# Altium footprint library Standard.PcbLib: 148 footprints (part 5 of 10)
Each footprint in its own frame and in the unit in brackets; x right, y up, seen from the top. Pads: shape width x height; smd on the part's side, far side on the other; paste and mask are expansions set on the pad; w line width, h text height; cw(c..) or ccw(c..) is an arc to the next point about the centre after c.
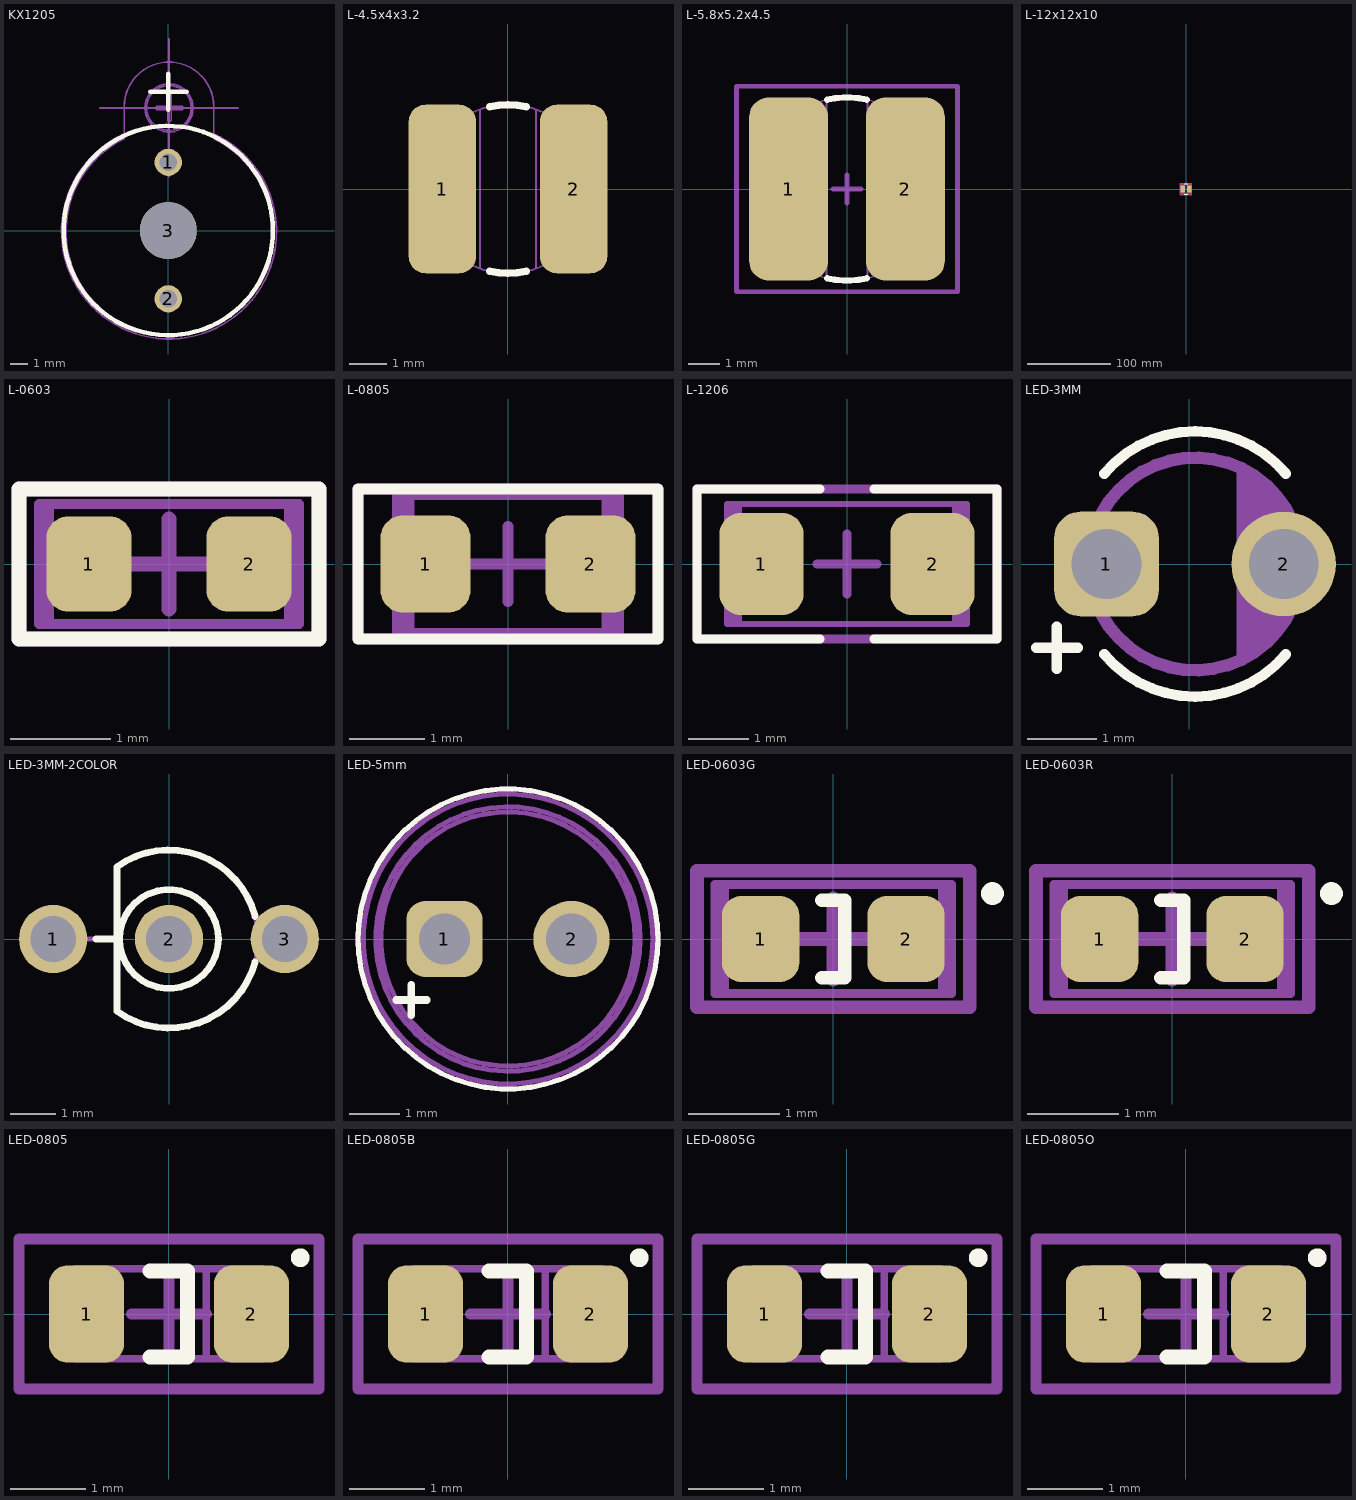
[diagram p4: the footprints below, top view; thin cyan lines are the x and y axes]

## KX1205 [mil]
pads (3):
  round 60 hole 38: 1(0,150) 2(0,-150)
  round 125 hole 125 unplated: 3(0,0)
Top Overlay:
  circle w10: c0,0 r230
  lines w10: -40,305 40,305 ; 0,265 0,345
Top Assembly:
  circle w3.94: c1.57,269.56 r52.93
  circle w3.94: c1.57,269.56 r48.99
  lines w3.94: -149.78,269.56 -96.85,269.56 1.57,269.56 ; -96.85,212.77 ccw(c1.57,-1.97) 100,212.77 ; 1.57,118.2 1.57,171.13 1.57,269.56 ; 1.57,420.92 1.57,367.98 1.57,269.56 ; 152.93,269.56 100,269.56 1.57,269.56 ; -96.85,201.89 ccw(c1.57,-1.97) 100,201.89 100,271.82 ccw(c1.57,271.82) -96.85,271.82 -96.85,201.89 ; -25.68,265.78 -25.68,273.26 -1.1,273.26 -1.1,297.84 6.38,297.84 6.38,273.26 30.95,273.26 30.95,265.78 6.38,265.78 6.38,241.21 -1.1,241.21 -1.1,265.78 -25.68,265.78
3D body "ALSRobot-BUZZER.step": height 379.92, standoff -177.17, extent -236.22,-236.22 236.22,372.21

## L-4.5x4x3.2 [mm]
pads (2):
  rrect50% 1.8x4.5 smd: 1(-1.75,0) 2(1.75,0)
Top Overlay:
  lines w0.2: -0.488,-2.196 ccw(c0,0) 0.488,-2.196 ; -0.488,2.196 cw(c0,0) 0.488,2.196
Top Assembly:
  lines w0.05: -2.23,-0.301 ccw(c0,0) 2.229,-0.304 ; -2.229,0.304 cw(c0,0) 2.23,0.301 ; -2.225,-0.3 -1.946,-0.3 ; -2.225,0.3 -1.946,0.3 ; -1.981,-0.3 ccw(c-1.981,0) -1.981,0.3 ; -0.75,-2.108 -0.75,2.125 ; 0.75,-2.108 0.75,2.1 ; 1.946,-0.3 2.225,-0.3 ; 1.946,0.3 2.225,0.3 ; 1.981,-0.3 cw(c1.981,0) 1.981,0.3
3D body "User Library-Inductor SDR0403 Series.STEP": height 3.25, standoff 0, extent -2.201,-2.25 2.201,2.25

## L-5.8x5.2x4.5 [mm] "Дроссель SMD"
height 4.5
pads (2):
  rrect50% 2.5x5.8 smd: 1(-1.85,0) 2(1.85,0)
Top Overlay:
  lines w0.2: -0.629,-2.831 ccw(c0,0) 0.629,-2.831 ; -0.629,2.831 cw(c0,0) 0.629,2.831
Top Assembly:
  lines w0.05: -2.681,-0.3 ccw(c-2.681,0) -2.681,0.3 ; -2.646,-0.3 -2.786,-0.3 -2.874,-0.388 ccw(c0,0) 2.873,-0.392 ; -2.646,0.3 -2.777,0.3 -2.873,0.396 cw(c0,0) 2.874,0.388 2.778,0.291 2.647,0.291 ; -0.65,-2.825 -0.65,2.825 ; 0.65,-2.825 0.65,2.825 ; 2.647,-0.309 2.788,-0.309 2.875,-0.396 ; 2.682,-0.309 cw(c2.682,-0.009) 2.682,0.291
Top Component Outline:
  lines w0.15: -0.45,0 0.45,0 ; 0,-0.45 0,0.45 ; -3.5,-3.25 -3.5,3.25 3.5,3.25 3.5,-3.25 -3.5,-3.25
3D body "SMD_Inductor_CD54.step": height 4.49, standoff -0.01, extent -2.9,-2.6 2.9,2.6

## L-12x12x10 [mm]
pads (2):
  rect 5x9 smd: 1(-4,0) 2(4,0)
Top Layer:
  region: -6.5,4.6 -6.5,4.758 -6.439,5.067 -6.318,5.358 -6.143,5.62 -5.92,5.843 -5.658,6.018 -5.367,6.139 -5.058,6.2 -4.9,6.2 -2.5,6.2 -2.5,3.874 -6.5,3.874
  region: -6.5,-4.6 -6.5,-4.758 -6.439,-5.067 -6.318,-5.358 -6.143,-5.62 -5.92,-5.843 -5.658,-6.018 -5.367,-6.139 -5.058,-6.2 -4.9,-6.2 -2.5,-6.2 -2.5,-3.874 -6.5,-3.874
  region: 6.5,-4.6 6.5,-4.758 6.439,-5.067 6.318,-5.358 6.143,-5.62 5.92,-5.843 5.658,-6.018 5.367,-6.139 5.058,-6.2 4.9,-6.2 2.5,-6.2 2.5,-3.969 6.5,-3.969
  region: 6.5,4.6 6.5,4.758 6.439,5.067 6.318,5.358 6.143,5.62 5.92,5.843 5.658,6.018 5.367,6.139 5.058,6.2 4.9,6.2 2.5,6.2 2.5,3.874 6.5,3.874
Top Overlay:
  lines w0.2: -2.046,-6.15 -2.046,-6.15 2.046,-6.15 ; -2.046,6.15 2.046,6.15
Top Solder:
  region: -6.6,-4.6 -6.602,-4.762 -6.545,-5.081 -6.428,-5.382 -6.256,-5.656 -6.034,-5.892 -5.771,-6.081 -5.476,-6.216 -5.162,-6.293 -5,-6.3 -2.4,-6.3 -2.4,-4.5 -6.6,-4.5
  region: -6.6,4.6 -6.602,4.762 -6.545,5.081 -6.428,5.382 -6.256,5.656 -6.034,5.892 -5.771,6.081 -5.476,6.216 -5.162,6.293 -5,6.3 -2.4,6.3 -2.4,4.5 -6.6,4.5
  region: 6.6,4.6 6.602,4.762 6.545,5.081 6.428,5.383 6.256,5.656 6.034,5.892 5.771,6.081 5.476,6.216 5.162,6.293 5,6.3 2.4,6.3 2.4,4.5 6.6,4.5
  region: 6.6,-4.6 6.602,-4.762 6.545,-5.081 6.428,-5.383 6.256,-5.656 6.034,-5.892 5.771,-6.081 5.476,-6.216 5.162,-6.293 5,-6.3 2.4,-6.3 2.4,-4.5 6.6,-4.5
Top Assembly:
  circle w0.05: c0,0 r5.25
  circle w0.05: c-2.828,2.828 r0.25
  circle w0.05: c0,0 r5
  lines w0.05: -4.58,-3.045 -4.359,-2.926 ; -4.58,3.045 -4.359,2.926 ; -4.049,-3.342 -4.581,-3.874 ccw(c0,0) -3.874,-4.581 -3.342,-4.049 ; -4.049,3.342 -4.581,3.874 cw(c0,0) -3.874,4.581 -3.342,4.049 ; -3.045,-4.58 -2.926,-4.359 ; -3.045,4.58 -2.926,4.359 ; -2.165,-5.056 -2.046,-4.835 ; -2.165,5.056 -2.046,4.835 ; 2.046,-4.835 2.165,-5.056 ; 2.046,4.835 2.165,5.056 ; 2.926,-4.359 3.045,-4.58 ; 2.926,4.359 3.045,4.58 ; 3.342,-4.049 3.874,-4.581 ccw(c0,0) 4.581,-3.874 4.049,-3.342 ; 3.342,4.049 3.874,4.581 cw(c0,0) 4.581,3.874 4.049,3.342 ; 4.359,-2.926 4.58,-3.045 ; 4.359,2.926 4.58,3.045 ; -6.25,-4.25 ccw(c-4.25,-4.25) -4.25,-6.25 ; -6.25,-4.25 -6.15,-4.25 ; -6.25,-4.25 -6.25,4.25 ; -6.25,4.25 cw(c-4.25,4.25) -4.25,6.25 ; -6.25,4.25 -6.15,4.25 ; -6.15,-4.25 ccw(c-4.25,-4.25) -4.25,-6.15 ; -6.15,-4.25 -6.15,4.25 ; -6.15,4.25 cw(c-4.25,4.25) -4.25,6.15 ; -4.809,-2.966 cw(c0,0) -4.809,2.966 ; -4.809,-2.966 ccw(c-4.25,-4.25) -2.966,-4.809 ; -4.809,-2.966 cw(c-7.071,-5.196) -4.699,-3.083 ; -4.809,-2.966 cw(c11.081,-87.461) -4.65,-2.937 ; -4.809,2.966 ccw(c11.081,87.461) -4.65,2.937 ; -4.809,2.966 ccw(c-7.056,5.182) -4.699,3.083 ; -4.809,2.966 cw(c-4.25,4.25) -2.966,4.809 ; -4.699,-3.083 ccw(c-4.25,-4.25) -3.083,-4.699 ; -4.699,-3.083 ccw(c-4.735,-2.99) -4.65,-2.937 ; -4.699,-3.083 -4.581,-3.044 -4.65,-2.937 ; -4.699,3.083 cw(c-4.735,2.99) -4.65,2.937 ; -4.699,3.083 cw(c-4.25,4.25) -3.083,4.699 ; -4.699,3.083 -4.581,3.044 -4.65,2.937 ; -4.65,-2.937 cw(c0,0) -4.65,2.937 ; -4.25,-6.25 -4.25,-6.15 ; -4.25,-6.25 4.25,-6.25 ; -4.25,-6.15 4.25,-6.15 ; -4.25,6.15 4.25,6.15 ; -4.25,6.15 -4.25,6.25 ; -4.25,6.25 4.25,6.25 ; -3.083,-4.699 cw(c-5.196,-7.071) -2.966,-4.809 ; -3.083,-4.699 cw(c-2.99,-4.735) -2.937,-4.65 ; -3.083,-4.699 -3.044,-4.581 -2.937,-4.65 ; -3.083,4.699 ccw(c-5.182,7.056) -2.966,4.809 ; -3.083,4.699 ccw(c-2.99,4.735) -2.937,4.65 ; -3.083,4.699 -3.044,4.581 -2.937,4.65 ; -2.966,-4.809 ccw(c0,0) 2.966,-4.809 ; -2.966,-4.809 ccw(c-91.284,11.797) -2.937,-4.65 ; -2.966,4.809 cw(c0,0) 2.966,4.809 ; -2.966,4.809 cw(c-87.461,-11.081) -2.937,4.65 ; -2.937,-4.65 ccw(c0,0) 2.937,-4.65 ; -2.937,4.65 cw(c0,0) 2.937,4.65 ; 2.937,-4.65 ccw(c91.284,11.797) 2.966,-4.809 ; 2.937,-4.65 cw(c2.99,-4.735) 3.083,-4.699 ; 2.937,-4.65 3.044,-4.581 3.083,-4.699 ; 2.937,4.65 cw(c87.461,-11.081) 2.966,4.809 ; 2.937,4.65 ccw(c2.99,4.735) 3.083,4.699 ; 2.937,4.65 3.044,4.581 3.083,4.699 ; 2.966,-4.809 cw(c5.196,-7.071) 3.083,-4.699 ; 2.966,-4.809 ccw(c4.25,-4.25) 4.809,-2.966 ; 2.966,4.809 ccw(c5.182,7.056) 3.083,4.699 ; 2.966,4.809 cw(c4.25,4.25) 4.809,2.966 ; 3.083,-4.699 ccw(c4.25,-4.25) 4.699,-3.083 ; 3.083,4.699 cw(c4.25,4.25) 4.699,3.083 ; 4.25,-6.25 ccw(c4.25,-4.25) 6.25,-4.25 ; 4.25,-6.25 4.25,-6.15 ; 4.25,-6.15 ccw(c4.25,-4.25) 6.15,-4.25 ; 4.25,6.15 cw(c4.25,4.25) 6.15,4.25 ; 4.25,6.15 4.25,6.25 ; 4.25,6.25 cw(c4.25,4.25) 6.25,4.25 ; 4.65,-2.937 cw(c-11.797,-91.284) 4.809,-2.966 ; 4.65,-2.937 ccw(c0,0) 4.65,2.937 ; 4.65,-2.937 ccw(c4.735,-2.99) 4.699,-3.083 ; 4.65,-2.937 4.581,-3.044 4.699,-3.083 ; 4.65,2.937 ccw(c-11.797,91.284) 4.809,2.966 ; 4.65,2.937 cw(c4.735,2.99) 4.699,3.083 ; 4.65,2.937 4.581,3.044 4.699,3.083 ; 4.699,-3.083 cw(c7.071,-5.196) 4.809,-2.966 ; 4.699,3.083 ccw(c7.056,5.182) 4.809,2.966 ; 4.809,-2.966 ccw(c0,0) 4.809,2.966 ; 6.15,-4.25 6.25,-4.25 ; 6.15,-4.25 6.15,4.25 ; 6.15,4.25 6.25,4.25 ; 6.25,-4.25 6.25,4.25
Top Component Outline:
  lines w0.15: -0.45,0 0.45,0 ; 0,-0.45 0,0.45 ; -7,-6.75 7,-6.75 7,6.75 -7,6.75 -7,-6.75
3D body "User Library-SRR1210A.STEP": height 10, standoff 0, extent -6.004,-6 6.004,6

## L-0603 [mm]
height 0.6
pads (2):
  rrect50% 0.85x0.95 smd: 1(-0.8,0) 2(0.8,0)
Top Overlay:
  lines w0.15: -1.5,-0.75 -1.5,0.75 0,0.75 1.5,0.75 1.5,-0.75 0,-0.75 -1.5,-0.75
Top Assembly:
  lines w0.1: -1.2,-0.6 -1.2,0.6 ; 1.2,-0.6 1.2,0.6 ; -1.3,-0.6 -1.3,0.6 1.3,0.6 1.3,-0.6 -1.3,-0.6
Top Component Outline:
  lines w0.15: -0.45,0 0.45,0 ; 0,-0.45 0,0.45 ; -1.5,-0.75 -1.5,0.75 1.5,0.75 1.5,-0.75 -1.5,-0.75
3D body "INDC-0603 (1).stp": height 0.95, standoff 0, extent -0.875,-0.475 0.875,0.475

## L-0805 [mm] "hip Inductor, 2-Leads, Body 2,00x1,25mm, IPC Medium Density"
pads (2):
  rrect50% 1.2x1.3 smd: 1(-1.1,0) 2(1.1,0)
Top Overlay:
  lines w0.15: -2,-1 2,-1 2,1 -2,1 -2,-1
Top Assembly:
  rectangle: 1.3,-0.9 1.5,0.9
  rectangle: -1.5,-0.9 -1.3,0.9
  lines w0.1: -1.3,-0.9 -1.3,0.9 ; 1.3,-0.9 1.3,0.9 ; -1.5,-0.9 1.5,-0.9 1.5,0.9 -1.5,0.9 -1.5,-0.9
Top Component Outline:
  lines w0.15: -0.5,0 0.5,0 ; 0,-0.5 0,0.5 ; -2,-1 2,-1 2,1 -2,1 -2,-1
3D body "User Library-ind_0805.STEP": height 0.95, standoff 0, extent -1,-0.6 1,0.6

## L-1206 [mm] "Chip Inductor 2-Leads, Body 3,20x1,60mm, IPC Medium Density"
height 0.7
pads (2):
  rrect50% 1.4x1.7 smd: 1(-1.425,0) 2(1.425,0)
Top Overlay:
  lines w0.15: -0.45,-1.25 -2.5,-1.25 -2.5,1.25 -0.45,1.25 ; 0.45,-1.25 2.5,-1.25 2.5,1.25 0.45,1.25
Top Assembly:
  rectangle: -1.95,-1 -1.75,1
  rectangle: 1.75,-1 1.95,1
  lines w0.1: -2,-1 2,-1 2,1 -2,1 -2,-1
Top Component Outline:
  lines w0.15: -0.5,0 0.5,0 ; 0,-0.5 0,0.5 ; -2.5,-1.25 2.5,-1.25 2.5,1.25 -2.5,1.25 -2.5,-1.25
3D body "User Library-BLM31PG330SN1.STEP": height 1.11, standoff -0.01, extent -1.6,-0.81 1.6,0.81

## LED-3MM [mm]
pads (2):
  rrect50% 1.5x1.5 hole 1: 1(-1.19,0)
  round 1.5 hole 1: 2(1.35,0)
Top Overlay:
  lines w0.15: -2.2,-1.2 -1.6,-1.2 ; -1.9,-1.5 -1.9,-0.9 ; -1.223,-1.293 ccw(c0.08,-0.2) 1.383,-1.293 ; -1.223,1.293 cw(c0.08,0.2) 1.383,1.293
Top Assembly:
  circle w0.178: c0.08,0 r1.524
  region: 0.68,1.4 0.68,-1.4 0.88,-1.3 1.08,-1.1 1.18,-1 1.48,-0.6 1.58,-0.3 1.58,0.2 1.48,0.5 1.38,0.7 1.28,0.9 1.08,1.1 0.88,1.3
3D body "User Library-Led round 3 mm Kingbright.step": height 29.6, standoff -2, extent -1.5,-1.6 1.7,1.6

## LED-3MM-2COLOR [mm]
pads (3):
  round 1.5 hole 1: 1(-2.54,0) 2(0,0) 3(2.54,0)
Top Overlay:
  circle w0.15: c0,0 r1.085
  lines w0.15: -1.6,0 -1.143,0 ; -1.144,-1.583 ccw(c0,0) 1.888,-0.5 ; -1.143,-1.583 -1.143,1.586 ; -1.14,1.586 cw(c0,0) 1.889,0.496
Top Assembly:
  circle w0.1: c0,0 r1.085
  lines w0.1: -2.286,0 -1.143,0 ; -1.143,-1.524 -1.143,1.524 ; -1.111,-1.606 ccw(c0,0) -1.111,1.606 ; 1.905,0 2.54,0
3D body "User Library-Lumex_SSL-LX3059IGW_BicolorLed.step": height 15, standoff -1.18, extent -2.794,-1.992 2.794,1.992

## LED-5mm [mm]
pads (2):
  rrect50% 1.5x1.5 hole 1: 1(-1.25,0)
  round 1.5 hole 1: 2(1.25,0)
Top Overlay:
  circle w0.1: c0,0 r2.95
  lines w0.15: -2.2,-1.2 -1.6,-1.2 ; -1.9,-1.5 -1.9,-0.9
Top Assembly:
  circle w0.1: c0,0 r2.95
  circle w0.1: c0,0 r2.85
  circle w0.1: c0,0 r2.6
  circle w0.1: c0,0 r2.5
3D body "User Library-LED5MM.SLDPRT": height 12.6, standoff -3, extent -2.95,-2.95 2.95,2.95

## LED-0603G [mm]
height 0.6
pads (2):
  rrect50% 0.85x0.95 smd: 1(-0.8,0) 2(0.8,0)
Top Overlay:
  circle w0.15: c1.75,0.5 r0.05
  lines w0.15: -0.125,-0.425 0.125,-0.425 0.125,0.425 -0.125,0.425
Top Assembly:
  lines w0.1: -1.2,-0.6 -1.2,0.6 ; 1.2,-0.6 1.2,0.6 ; -1.3,-0.6 -1.3,0.6 1.3,0.6 1.3,-0.6 -1.3,-0.6
Top Component Outline:
  lines w0.15: -0.45,0 0.45,0 ; 0,-0.45 0,0.45 ; -1.5,-0.75 -1.5,0.75 1.5,0.75 1.5,-0.75 -1.5,-0.75
3D body "User Library-LED-0603-G.STEP": height 0.65, standoff 0.05, extent -0.8,-0.4 0.8,0.4

## LED-0603R [mm]
height 0.6
pads (2):
  rrect50% 0.85x0.95 smd: 1(-0.8,0) 2(0.8,0)
Top Overlay:
  circle w0.15: c1.75,0.5 r0.05
  lines w0.15: -0.125,-0.425 0.125,-0.425 0.125,0.425 -0.125,0.425
Top Assembly:
  lines w0.1: -1.2,-0.6 -1.2,0.6 ; 1.2,-0.6 1.2,0.6 ; -1.3,-0.6 -1.3,0.6 1.3,0.6 1.3,-0.6 -1.3,-0.6
Top Component Outline:
  lines w0.15: -0.45,0 0.45,0 ; 0,-0.45 0,0.45 ; -1.5,-0.75 -1.5,0.75 1.5,0.75 1.5,-0.75 -1.5,-0.75
3D body "User Library-LED-0603-R.STEP": height 0.65, standoff 0.05, extent -0.8,-0.4 0.8,0.4

## LED-0805 [mm] "Chip Led, 2-Leads, Body 2,00x1,25mm, IPC Medium Density"
height 0.7
pads (2):
  rrect50% 1x1.3 smd: 1(-1.1,0) 2(1.1,0)
Top Overlay:
  circle w0.15: c1.75,0.75 r0.05
  lines w0.2: -0.25,-0.575 0.25,-0.575 0.25,0.575 -0.25,0.575
Top Assembly:
  lines w0.1: 0.5,-0.6 0.5,0.6 ; 0.75,-0.6 0.75,0.6 ; -1.25,-0.6 -1.25,0.6 1.25,0.6 1.25,-0.6 -1.25,-0.6
Top Component Outline:
  lines w0.15: -0.5,0 0.5,0 ; 0,-0.5 0,0.5 ; -2,-1 -2,1 2,1 2,-1 -2,-1
3D body "ALSRobot-LED 0805.STEP": height 1.1, standoff 0, extent -1.01,-0.625 1.01,0.625

## LED-0805B [mm] "Chip Led, 2-Leads, Body 2,00x1,25mm, IPC Medium Density"
height 0.7
pads (2):
  rrect50% 1x1.3 smd: 1(-1.1,0) 2(1.1,0)
Top Overlay:
  circle w0.15: c1.75,0.75 r0.05
  lines w0.2: -0.25,-0.575 0.25,-0.575 0.25,0.575 -0.25,0.575
Top Assembly:
  lines w0.1: 0.5,-0.6 0.5,0.6 ; 0.75,-0.6 0.75,0.6 ; -1.25,-0.6 1.25,-0.6 1.25,0.6 -1.25,0.6 -1.25,-0.6
Top Component Outline:
  lines w0.15: -0.5,0 0.5,0 ; 0,-0.5 0,0.5 ; -2,-1 2,-1 2,1 -2,1 -2,-1
3D body "User Library-led_0805B.STEP": height 1.1, standoff 0, extent -1.01,-0.625 1.01,0.625

## LED-0805G [mm] "Chip Led, 2-Leads, Body 2,00x1,25mm, IPC Medium Density"
height 0.7
pads (2):
  rrect50% 1x1.3 smd: 1(-1.1,0) 2(1.1,0)
Top Overlay:
  circle w0.15: c1.75,0.75 r0.05
  lines w0.2: -0.25,-0.575 0.25,-0.575 0.25,0.575 -0.25,0.575
Top Assembly:
  lines w0.1: 0.5,-0.6 0.5,0.6 ; 0.75,-0.6 0.75,0.6 ; -1.25,-0.6 1.25,-0.6 1.25,0.6 -1.25,0.6 -1.25,-0.6
Top Component Outline:
  lines w0.15: -0.5,0 0.5,0 ; 0,-0.5 0,0.5 ; -2,-1 2,-1 2,1 -2,1 -2,-1
3D body "Led 0805-Green.STEP": height 1.1, standoff 0, extent -1.01,-0.625 1.01,0.625

## LED-0805O [mm] "Chip Led, 2-Leads, Body 2,00x1,25mm, IPC Medium Density"
height 0.7
pads (2):
  rrect50% 1x1.3 smd: 1(-1.1,0) 2(1.1,0)
Top Overlay:
  circle w0.15: c1.75,0.75 r0.05
  lines w0.2: -0.25,-0.575 0.25,-0.575 0.25,0.575 -0.25,0.575
Top Assembly:
  lines w0.1: 0.5,-0.6 0.5,0.6 ; 0.75,-0.6 0.75,0.6 ; -1.25,-0.6 -1.25,0.6 1.25,0.6 1.25,-0.6 -1.25,-0.6
Top Component Outline:
  lines w0.15: -0.5,0 0.5,0 ; 0,-0.5 0,0.5 ; -2,-1 -2,1 2,1 2,-1 -2,-1
3D body "User Library-led_0805O.STEP": height 1.1, standoff 0, extent -1.01,-0.625 1.01,0.625